# Altium footprint library Switches.PcbLib: 117 footprints (part 3 of 8)
Each footprint in its own frame and in the unit in brackets; x right, y up, seen from the top. Pads: shape width x height; smd on the part's side, far side on the other; paste and mask are expansions set on the pad; w line width, h text height; cw(c..) or ccw(c..) is an arc to the next point about the centre after c.
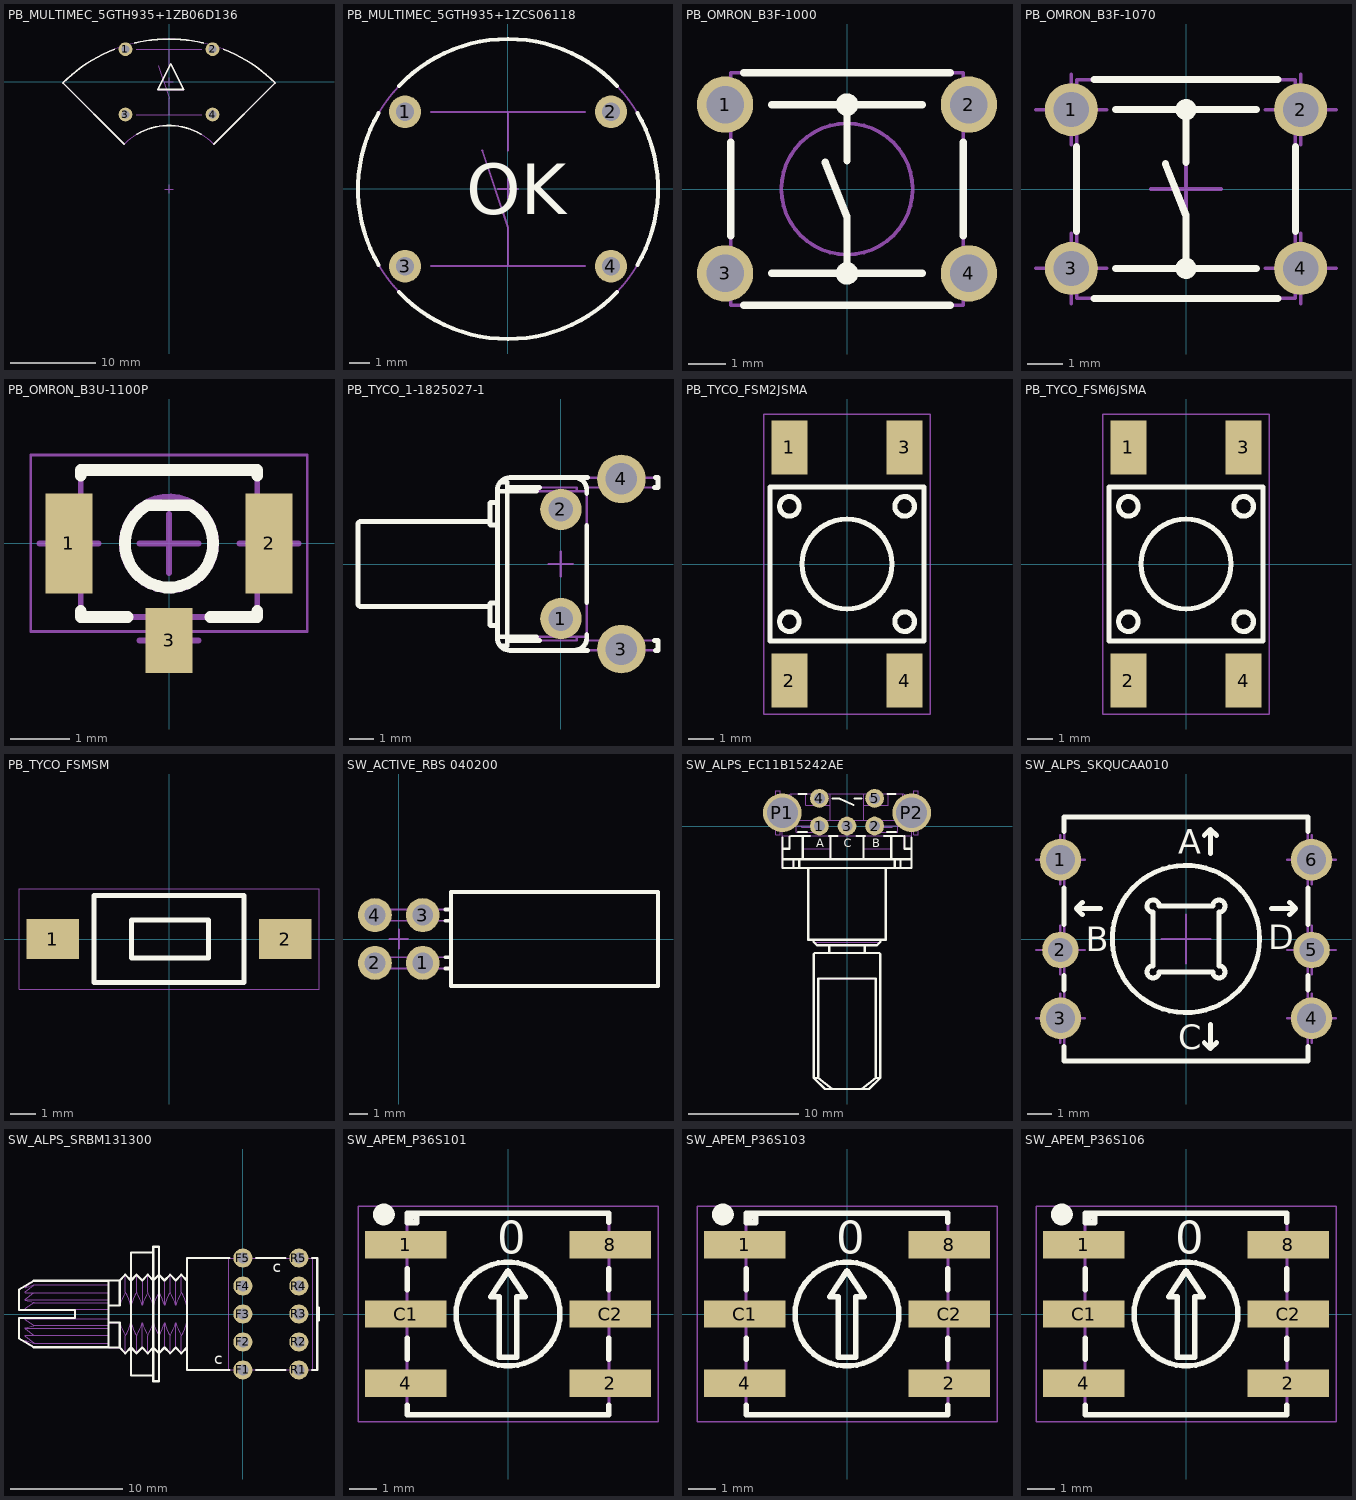
[diagram p2: the footprints below, top view; thin cyan lines are the x and y axes]

## PB_MULTIMEC_5GTH935+1ZB06D136 [mm] "Body 10.1x10.1mm, Pushbutton Switch Arc 24.76mmx17.5mm, MULTIMEC 5GTH935+1ZB"
height 12.5
pads (4):
  round 1.6 hole 0.9: 1(-5.08,3.81) 2(5.08,3.81) 3(-5.08,-3.81) 4(5.08,-3.81)
Top Overlay:
  lines w0.2: -6.38,3.796 ccw(c0,-12.5) -12.374,-0.126 -5.233,-7.267 ; -4.002,4.536 cw(c0,-12.5) 4.002,4.536 ; -3.751,-6.121 cw(c0,-12.5) 3.751,-6.121 ; 5.233,-7.267 12.374,-0.126 ccw(c0,-12.5) 6.38,3.796 ; -1.292,-0.896 1.708,-0.896 0.208,2.104 -1.292,-0.896
Mechanical 8:
  lines w0.1: -5.58,-3.81 -5.08,-3.81 ; -5.58,3.81 -5.08,3.81 ; -5.08,-4.31 -5.08,-3.81 ; -5.08,-3.31 -5.08,-3.81 ; -5.08,3.31 -5.08,3.81 ; -5.08,4.31 -5.08,3.81 ; -4.58,-3.81 -5.08,-3.81 ; -4.58,3.81 -5.08,3.81 ; -3.81,-3.81 3.81,-3.81 ; -3.81,3.81 3.81,3.81 ; -1.27,1.905 0,-1.905 0,-3.81 ; -0.5,-12.5 0,-12.5 ; 0,-13 0,-12.5 ; 0,-12 0,-12.5 ; 0,1.905 0,3.81 ; 0.5,-12.5 0,-12.5 ; 4.58,-3.81 5.08,-3.81 ; 4.58,3.81 5.08,3.81 ; 5.08,-4.31 5.08,-3.81 ; 5.08,-3.31 5.08,-3.81 ; 5.08,3.31 5.08,3.81 ; 5.08,4.31 5.08,3.81 ; 5.58,-3.81 5.08,-3.81 ; 5.58,3.81 5.08,3.81 ; 0,0 -0.5,0 0,0 ; 0,0 0,0.5 0,0 ; 0,0 0.5,0 0,0 ; 0,0 0,-0.5 0,0
  text "3" at -4.248,-2.975 h1
  text "4" at 3.372,-2.975 h1
  text "2" at 3.372,2.105 h1
  text "1" at -4.248,2.105 h1
Mechanical 14:
  lines w0.1: 5.23,-7.27 ccw(c-0.002,-12.494) -5.233,-7.267 -12.374,-0.126 cw(c0,-12.5) 12.374,-0.126 5.233,-7.267 ; -1.292,-0.896 1.708,-0.896 0.208,2.104 -1.292,-0.896
3D body "PB_MULTIMEC_5GTH935+1ZB06D136.stp": height 12.21, standoff -3.9, extent -11.9,-7.137 11.9,5

## PB_MULTIMEC_5GTH935+1ZCS06118 [mm] "Body 10.1x10.1mm, Pushbutton Switch Round Diam 14.3mm, MULTIMEC 5GTH935+1ZCS"
height 11.7
pads (4):
  round 1.6 hole 0.9: 1(-5.08,3.81) 2(5.08,3.81) 3(-5.08,-3.81) 4(5.08,-3.81)
Top Overlay:
  lines w0.2: -6.379,-3.751 cw(c0,0) -6.379,3.751 ; -5.387,-5.073 ccw(c0,0) 5.387,-5.073 ; -5.387,5.073 cw(c0,0) 5.387,5.073 ; 6.379,-3.751 ccw(c0,0) 6.379,3.751
  text "OK" at -2.055,-1.25 h2.5
Mechanical 8:
  lines w0.1: -5.58,-3.81 -5.08,-3.81 ; -5.58,3.81 -5.08,3.81 ; -5.08,-4.31 -5.08,-3.81 ; -5.08,-3.31 -5.08,-3.81 ; -5.08,3.31 -5.08,3.81 ; -5.08,4.31 -5.08,3.81 ; -4.58,-3.81 -5.08,-3.81 ; -4.58,3.81 -5.08,3.81 ; -3.81,-3.81 3.81,-3.81 ; -3.81,3.81 3.81,3.81 ; -1.27,1.905 0,-1.905 0,-3.81 ; -0.5,0 0,0 ; 0,-0.5 0,0 ; 0,0.5 0,0 ; 0,1.905 0,3.81 ; 0.5,0 0,0 ; 4.58,-3.81 5.08,-3.81 ; 4.58,3.81 5.08,3.81 ; 5.08,-4.31 5.08,-3.81 ; 5.08,-3.31 5.08,-3.81 ; 5.08,3.31 5.08,3.81 ; 5.08,4.31 5.08,3.81 ; 5.58,-3.81 5.08,-3.81 ; 5.58,3.81 5.08,3.81
  text "1" at -4.248,2.105 h1
  text "2" at 3.372,2.105 h1
  text "4" at 3.372,-2.975 h1
  text "3" at -4.248,-2.975 h1
Mechanical 14:
  circle w0.1: c0,0 r7.4
  text "OK" at -2.055,-1.25 h2.5
3D body "PB_MULTIMEC_5GTH935+1ZCS06118.stp": height 11.69, standoff -3.9, extent -7.148,-7.158 7.148,7.138

## PB_OMRON_B3F-1000 [mm] "6x6mm Model, Horizontal, Flat Plunger Type (without Ground Terminal) Pushbutton Switch, OMRON B3F Series"
height 4.5
pads (4):
  round 1.5 hole 1: 1(-3.25,2.25) 2(3.25,2.25) 3(-3.25,-2.25) 4(3.25,-2.25)
Top Overlay:
  circle w0.2: c0,2.25 r0.2
  circle w0.2: c0,-2.25 r0.2
  lines w0.2: -3.1,-1.25 -3.1,1.25 ; -2.75,-3.1 2.75,-3.1 ; -2.75,3.1 2.75,3.1 ; -2,-2.25 2,-2.25 ; -2,2.25 2,2.25 ; -0.586,0.716 0,-0.75 0,-2.25 ; 0,0.75 0,2.25 ; 3.1,-1.25 3.1,1.25
Mechanical 14:
  circle w0.1: c0,0 r1.75
  lines w0.1: -3.1,-2.6 -3.4,-2.6 -3.4,-1.9 -3.1,-1.9 ; -3.1,1.9 -3.4,1.9 -3.4,2.6 -3.1,2.6 ; 3.1,-2.6 3.4,-2.6 3.4,-1.9 3.1,-1.9 ; 3.1,1.9 3.4,1.9 3.4,2.6 3.1,2.6 ; -3.1,-3.1 3.1,-3.1 3.1,3.1 -3.1,3.1 -3.1,-3.1
3D body "PB_OMRON_B3F-1000.stp": height 4.3, standoff -3.6, extent -3.4,-3.1 3.4,3.1

## PB_OMRON_B3F-1070 [mm] "6x6mm Model, Horizontal, Flat Plunger Type (without Ground Terminal) Pushbutton Switch, OMRON B3F Series"
height 9.5
pads (4):
  round 1.5 hole 1: 1(-3.25,2.25) 2(3.25,2.25) 3(-3.25,-2.25) 4(3.25,-2.25)
Top Overlay:
  circle w0.2: c0,2.25 r0.2
  circle w0.2: c0,-2.25 r0.2
  lines w0.2: -3.1,-1.2 -3.1,1.2 ; -2.6,-3.1 2.6,-3.1 ; -2.6,3.1 2.6,3.1 ; -2,-2.25 2,-2.25 ; -2,2.25 2,2.25 ; -0.586,0.716 0,-0.75 0,-2.25 ; 0,0.75 0,2.25 ; 3.1,-1.2 3.1,1.2
Mechanical 8:
  lines w0.1: -4.25,-2.25 -3.25,-2.25 ; -4.25,2.25 -3.25,2.25 ; -3.25,-3.25 -3.25,-2.25 ; -3.25,-1.25 -3.25,-2.25 ; -3.25,1.25 -3.25,2.25 ; -3.25,3.25 -3.25,2.25 ; -2.25,-2.25 -3.25,-2.25 ; -2.25,2.25 -3.25,2.25 ; -1,0 0,0 ; 0,-1 0,0 ; 0,1 0,0 ; 1,0 0,0 ; 2.25,-2.25 3.25,-2.25 ; 2.25,2.25 3.25,2.25 ; 3.25,-3.25 3.25,-2.25 ; 3.25,-1.25 3.25,-2.25 ; 3.25,1.25 3.25,2.25 ; 3.25,3.25 3.25,2.25 ; 4.25,-2.25 3.25,-2.25 ; 4.25,2.25 3.25,2.25
Mechanical 14:
  circle w0.1: c0,2.25 r0.1
  circle w0.1: c0,-2.25 r0.1
  lines w0.1: -3.1,-2.6 -3.4,-2.6 -3.4,-1.9 -3.1,-1.9 ; -3.1,1.9 -3.4,1.9 -3.4,2.6 -3.1,2.6 ; -2,-2.25 2,-2.25 ; -2,2.25 2,2.25 ; -0.586,0.716 0,-0.75 0,-2.25 ; 0,0.75 0,2.25 ; 3.1,-2.6 3.4,-2.6 3.4,-1.9 3.1,-1.9 ; 3.1,1.9 3.4,1.9 3.4,2.6 3.1,2.6 ; -3.1,-3.1 -3.1,3.1 3.1,3.1 3.1,-3.1 -3.1,-3.1
3D body "PB_OMRON_B3F-1070.stp": height 9.5, standoff -3.6, extent -3.4,-3.1 3.4,3.1

## PB_OMRON_B3U-1100P [mm] "Body 1.2x3x2.5mm Ultra-Small Tactile Pushbutton Switch, (with Ground Terminal), OMRON B3U Series"
height 1.75
pads (3):
  rect 0.8x1.7 smd: 1(-1.7,0) 2(1.7,0)
  rect 0.8x1.1 smd: 3(0,-1.65)
Top Overlay:
  lines w0.2: -1.5,-1.15 -1.5,-1.25 -0.7,-1.25 ; -1.5,1.15 -1.5,1.25 1.5,1.25 1.5,1.15 ; 0.7,-1.25 1.5,-1.25 1.5,-1.15 ; -0.374,0.65 ccw(c0,0) 0.374,0.65 -0.374,0.65
Mechanical 8:
  lines w0.1: -2.2,0 -1.7,0 ; -1.7,-0.5 -1.7,0 ; -1.7,0.5 -1.7,0 ; -1.2,0 -1.7,0 ; -0.5,-1.65 0,-1.65 ; -0.5,0 0,0 ; 0,-2.15 0,-1.65 ; 0,-1.15 0,-1.65 ; 0,-0.5 0,0 ; 0,0.5 0,0 ; 0.5,-1.65 0,-1.65 ; 0.5,0 0,0 ; 1.2,0 1.7,0 ; 1.7,-0.5 1.7,0 ; 1.7,0.5 1.7,0 ; 2.2,0 1.7,0
Mechanical 14:
  circle w0.1: c0,0 r0.8
  lines w0.1: -1.505,-0.701 -2.006,-0.701 -2.006,0.701 -1.505,0.701 ; -0.251,-1.25 -0.251,-1.959 0.251,-1.959 0.251,-1.25 ; 1.505,-0.701 2.006,-0.701 2.006,0.701 1.505,0.701 ; -1.5,-1.25 1.5,-1.25 1.5,1.25 -1.5,1.25 -1.5,-1.25 ; -0.374,0.65 ccw(c0,0) 0.374,0.65 -0.374,0.65
Mechanical 15:
  lines w0.05: -2.35,-1.5 -2.35,1.5 2.35,1.5 2.35,-1.5 -2.35,-1.5
3D body "PB_OMRON_B3U-1100P.stp": height 1.75, standoff 0, extent -2,-1.95 2,1.25

## PB_TYCO_1-1825027-1 [mm] "Right Angle Micro Miniature Tactile Pushbutton Switche, Round Actuator Length = 5.74mm, FSMRAJ Serie"
height 7.01
pads (4):
  round 1.7 hole 1: 1(0,-2.25) 2(0,2.25)
  round 2 hole 1.3: 3(2.49,-3.505) 4(2.49,3.505)
Top Overlay:
  lines w0.2: -2.921,-1.753 -8.23,-1.753 cw(c-8.23,-1.626) -8.357,-1.626 -8.357,1.626 cw(c-8.23,1.626) -8.23,1.753 -2.921,1.753 ; -2.616,-2.997 -2.21,-2.997 -1.002,-2.997 ; -2.616,-2.54 -2.87,-2.54 cw(c-2.87,-2.489) -2.921,-2.489 -2.921,-1.651 cw(c-2.87,-1.651) -2.87,-1.6 -2.616,-1.6 ; -2.616,1.6 -2.87,1.6 cw(c-2.87,1.651) -2.921,1.651 -2.921,2.489 cw(c-2.87,2.489) -2.87,2.54 -2.616,2.54 ; -2.616,2.997 -2.21,2.997 -1.002,2.997 ; -2.494,-3.378 -2.21,-3.378 -2.21,3.378 -2.494,3.378 ; -2.21,-3.15 -0.868,-3.15 ; -2.21,3.15 -0.868,3.15 ; 0.559,-3.556 ccw(c0.559,-3.048) 1.067,-3.048 ; 0.559,3.556 cw(c0.559,3.048) 1.067,3.048 ; 1.067,-3.15 1.067,-2.901 ; 1.067,-1.599 1.067,1.599 ; 1.067,2.901 1.067,3.15 ; 1.091,-3.556 -2.108,-3.556 cw(c-2.108,-3.048) -2.616,-3.048 -2.616,3.048 cw(c-2.108,3.048) -2.108,3.556 1.091,3.556 ; 3.844,-3.15 4.001,-3.15 4.001,-3.556 3.889,-3.556 ; 3.844,3.15 4.001,3.15 4.001,3.556 3.889,3.556
Mechanical 8:
  lines w0.1: -0.5,-2.25 0,-2.25 ; -0.5,0 0,0 ; -0.5,2.25 0,2.25 ; 0,-2.75 0,-2.25 ; 0,-1.75 0,-2.25 ; 0,-0.5 0,0 ; 0,0.5 0,0 ; 0,1.75 0,2.25 ; 0,2.75 0,2.25 ; 0.5,-2.25 0,-2.25 ; 0.5,0 0,0 ; 0.5,2.25 0,2.25 ; 1.99,-3.505 2.49,-3.505 ; 1.99,3.505 2.49,3.505 ; 2.49,-4.005 2.49,-3.505 ; 2.49,-3.005 2.49,-3.505 ; 2.49,3.005 2.49,3.505 ; 2.49,4.005 2.49,3.505 ; 2.99,-3.505 2.49,-3.505 ; 2.99,3.505 2.49,3.505
Mechanical 14:
  lines w0.1: -2.921,-1.753 -8.23,-1.753 cw(c-8.23,-1.626) -8.357,-1.626 -8.357,1.626 cw(c-8.23,1.626) -8.23,1.753 -2.921,1.753 ; -2.616,-2.997 -2.21,-2.997 1.067,-2.997 1.067,3.15 4.001,3.15 4.001,3.556 -2.108,3.556 ccw(c-2.108,3.048) -2.616,3.048 -2.616,-3.048 ccw(c-2.108,-3.048) -2.108,-3.556 4.001,-3.556 4.001,-3.15 1.067,-3.15 ; -2.616,-2.54 -2.87,-2.54 cw(c-2.87,-2.489) -2.921,-2.489 -2.921,-1.651 cw(c-2.87,-1.651) -2.87,-1.6 -2.616,-1.6 ; -2.616,1.6 -2.87,1.6 cw(c-2.87,1.651) -2.921,1.651 -2.921,2.489 cw(c-2.87,2.489) -2.87,2.54 -2.616,2.54 ; -2.616,2.997 -2.21,2.997 1.067,2.997 ; -2.494,-3.378 -2.21,-3.378 -2.21,3.378 -2.494,3.378 ; -2.21,-3.15 0.66,-3.15 0.66,-2.997 ; -2.21,3.15 0.66,3.15 0.66,2.997 ; 0.559,-3.556 ccw(c0.559,-3.048) 1.067,-3.048 ; 0.559,3.556 cw(c0.559,3.048) 1.067,3.048 ; 1.994,-3.556 1.994,-4.204 2.985,-4.204 2.985,-3.556 ; 1.994,3.556 1.994,4.204 2.985,4.204 2.985,3.556 ; 2.654,-3.556 2.654,-3.15 ; 2.654,3.15 2.654,3.556
3D body "PB_TYCO_1-1825027-1.stp": height 7.01, standoff -3.51, extent -8.356,-4.204 4.001,4.204

## PB_TYCO_FSM2JSMA [mm] "Body 6mm x 6mm, Surface Mount Tactile Switches, TYCO FSMJSMA Series"
height 4.59
pads (4):
  rect 1.4x2.1 smd: 1(-2.25,4.55) 2(-2.25,-4.55) 3(2.25,4.55) 4(2.25,-4.55)
Top Overlay:
  circle w0.2: c0,0 r1.753
  circle w0.2: c2.248,2.248 r0.381
  circle w0.2: c2.248,-2.248 r0.381
  circle w0.2: c-2.248,2.248 r0.381
  circle w0.2: c-2.248,-2.248 r0.381
  lines w0.2: -3,-3 -3,3 3,3 3,-3 -3,-3
Mechanical 14:
  circle w0.1: c0,0 r1.753
  circle w0.1: c2.248,2.248 r0.381
  circle w0.1: c2.248,-2.248 r0.381
  circle w0.1: c-2.248,2.248 r0.381
  circle w0.1: c-2.248,-2.248 r0.381
  lines w0.1: -3,-3 -3,3 3,3 3,-3 -3,-3
Mechanical 15:
  lines w0.05: -3.25,-5.85 -3.25,5.85 3.25,5.85 3.25,-5.85 -3.25,-5.85
3D body "PB_TYCO_FSM2JSMA.stp": height 4.39, standoff 0, extent -3,-5 3,5

## PB_TYCO_FSM6JSMA [mm] "Body 6mm x 6mm, Surface Mount Tactile Switches, TYCO FSM6JSMA Series"
height 7.11
pads (4):
  rect 1.4x2.1 smd: 1(-2.25,4.55) 2(-2.25,-4.55) 3(2.25,4.55) 4(2.25,-4.55)
Top Overlay:
  circle w0.2: c-2.248,-2.248 r0.381
  circle w0.2: c-2.248,2.248 r0.381
  circle w0.2: c2.248,-2.248 r0.381
  circle w0.2: c2.248,2.248 r0.381
  circle w0.2: c0,0 r1.753
  lines w0.2: -3,-3 3,-3 3,3 -3,3 -3,-3
Mechanical 14:
  circle w0.1: c-2.248,-2.248 r0.381
  circle w0.1: c-2.248,2.248 r0.381
  circle w0.1: c2.248,-2.248 r0.381
  circle w0.1: c2.248,2.248 r0.381
  circle w0.1: c0,0 r1.753
  lines w0.1: -3,-3 3,-3 3,3 -3,3 -3,-3
Mechanical 15:
  lines w0.05: -3.25,-5.85 3.25,-5.85 3.25,5.85 -3.25,5.85 -3.25,-5.85
3D body "PB_TYCO_FSM6JSMA.stp": height 7.11, standoff 0, extent -3,-5 3,5

## PB_TYCO_FSMSM [mm] "Body 3.5x6.0mm, Pushbutton Switch,  TYCO FSMSM Serie"
height 4.3
pads (2):
  rect 2.1x1.6 smd: 1(-4.65,0) 2(4.65,0)
Top Overlay:
  lines w0.2: -3,-1.75 3,-1.75 3,1.75 -3,1.75 -3,-1.75 ; -1.5,-0.75 1.575,-0.75 1.575,0.75 -1.5,0.75 -1.5,-0.75
Mechanical 14:
  lines w0.1: -3,-1.75 -3,1.75 3,1.75 3,-1.75 -3,-1.75 ; -1.5,-0.75 -1.5,0.75 1.575,0.75 1.575,-0.75 -1.5,-0.75
Mechanical 15:
  lines w0.05: -6,-2 6,-2 6,2 -6,2 -6,-2
3D body "PB_TYCO_FSMSM.stp": height 4.3, standoff 0, extent -5,-1.75 5,1.75

## SW_ACTIVE_RBS 040200 [mm] "Body L  11mm x W 5mm x H 6mm - Rollerball Tilt Switch"
height 6
pads (4):
  round 1.8 hole 1.1: 1(1.27,-1.27) 2(-1.27,-1.27) 3(1.27,1.27) 4(-1.27,1.27)
Top Overlay:
  lines w0.2: 2.483,-1.57 2.77,-1.57 ; 2.483,-0.97 2.77,-0.97 ; 2.483,0.97 2.77,0.97 ; 2.483,1.57 2.77,1.57 ; 2.77,-2.5 13.77,-2.5 13.77,2.5 2.77,2.5 2.77,-2.5
Mechanical 8:
  lines w0.1: -1.77,-1.27 -1.27,-1.27 ; -1.77,1.27 -1.27,1.27 ; -1.27,-1.77 -1.27,-1.27 ; -1.27,-0.77 -1.27,-1.27 ; -1.27,0.77 -1.27,1.27 ; -1.27,1.77 -1.27,1.27 ; -0.77,-1.27 -1.27,-1.27 ; -0.77,1.27 -1.27,1.27 ; -0.5,0 0,0 ; 0,-0.5 0,0 ; 0,0.5 0,0 ; 0.5,0 0,0 ; 0.77,-1.27 1.27,-1.27 ; 0.77,1.27 1.27,1.27 ; 1.27,-1.77 1.27,-1.27 ; 1.27,-0.77 1.27,-1.27 ; 1.27,0.77 1.27,1.27 ; 1.27,1.77 1.27,1.27 ; 1.77,-1.27 1.27,-1.27 ; 1.77,1.27 1.27,1.27
Mechanical 14:
  lines w0.1: 2.77,-1.57 -1.57,-1.57 -1.57,-0.97 2.77,-0.97 ; 2.77,0.97 -1.57,0.97 -1.57,1.57 2.77,1.57 ; 2.77,-2.5 13.77,-2.5 13.77,2.5 2.77,2.5 2.77,-2.5
3D body "SW_ACTIVE_RBS 040200.stp": height 6, standoff -3.6, extent -1.57,-2.5 13.77,2.5

## SW_ALPS_EC11B15242AE [mm] "Encoder, Horizontal With Push-on Switch, ALPS EC11 Series"
height 13.8
pads (7):
  round 1.7 hole 1: 1(-2.5,0) 2(2.5,0) 3(0,0) 4(-2.5,2.5) 5(2.5,2.5)
  round 3.5 hole 2.8: P1(-5.85,1.2) P2(5.85,1.2)
Top Overlay:
  lines w0.2: -5.85,-3 5.85,-3 ; -5.85,-2.05 -5.2,-2.05 -5.2,-0.954 ; -5.85,-1.05 -5.85,-3.8 5.85,-3.8 5.85,-1.05 ; -5.042,-0.9 -3.367,-0.9 ; -4.85,-3.8 -4.85,-3 ; -4.436,-0.55 -3.622,-0.55 ; -4.376,2.9 -3.684,2.9 ; -4.33,-3.8 -4.33,-3 ; -4,-3 -4,-0.9 ; -3.5,-3.8 -3.5,-10.3 3.5,-10.3 3.5,-3.8 ; -3.02,-10.3 -3.02,-10.5 -2.72,-10.8 2.72,-10.8 3.02,-10.5 3.02,-10.3 ; -1.633,-0.9 -0.867,-0.9 ; -1.614,-11.5 -1.614,-10.8 ; -1.5,-3 -1.5,-0.9 ; -1.323,-23.8 -2.598,-22.8 ; -1.3,2.5 -0.7,2.5 0.6,1.9 ; 0.7,2.5 1.3,2.5 ; 0.867,-0.9 1.633,-0.9 ; 1.323,-23.8 2.598,-22.8 ; 1.5,-3 1.5,-0.9 ; 1.614,-11.5 1.614,-10.8 ; 3.367,-0.9 5.042,-0.9 ; 3.622,-0.55 4.436,-0.55 ; 3.684,2.9 4.376,2.9 ; 4,-3 4,-0.9 ; 4.33,-3.8 4.33,-3 ; 4.85,-3.8 4.85,-3 ; 5.2,-0.9 5.2,-2.05 5.85,-2.05 ; -3,-22.8 -2.598,-22.8 ; -3,-22.8 -3,-11.6 -2.9,-11.5 2.9,-11.5 3,-11.6 3,-22.8 ; -3,-22.8 -2,-23.8 2,-23.8 3,-22.8 ; -2.598,-22.8 -2.598,-13.8 2.598,-13.8 2.598,-22.8 ; 2.598,-22.8 3,-22.8
  text "A" at -2.8,-1.9 h0.75
  text "B" at 2.3,-1.9 h0.75
  text "C" at -0.3,-1.9 h0.75
Mechanical 8:
  circle w0.05: c5.85,1.2 r1.4
  circle w0.05: c-5.85,1.2 r1.4
  circle w0.05: c-2.5,2.5 r0.5
  circle w0.05: c2.5,2.5 r0.5
  circle w0.05: c-2.5,0 r0.5
  circle w0.05: c2.5,0 r0.5
  circle w0.05: c0,0 r0.5
  lines w0.05: -6.35,1.2 -5.85,1.2 ; -5.85,0.7 -5.85,1.2 ; -5.85,1.7 -5.85,1.2 ; -5.35,1.2 -5.85,1.2 ; -3,0 -2.5,0 ; -3,2.5 -2.5,2.5 ; -2.5,-0.5 -2.5,0 ; -2.5,0.5 -2.5,0 ; -2.5,2 -2.5,2.5 ; -2.5,3 -2.5,2.5 ; -2,0 -2.5,0 ; -2,2.5 -2.5,2.5 ; -0.5,0 0,0 ; 0,-0.5 0,0 ; 0,0.5 0,0 ; 0.5,0 0,0 ; 2,0 2.5,0 ; 2,2.5 2.5,2.5 ; 2.5,-0.5 2.5,0 ; 2.5,0.5 2.5,0 ; 2.5,2 2.5,2.5 ; 2.5,3 2.5,2.5 ; 3,0 2.5,0 ; 3,2.5 2.5,2.5 ; 5.35,1.2 5.85,1.2 ; 5.85,0.7 5.85,1.2 ; 5.85,1.7 5.85,1.2 ; 6.35,1.2 5.85,1.2 ; -6.75,0.15 -6.75,2.25 -4.95,2.25 -4.95,0.15 -6.75,0.15 ; 4.95,0.15 4.95,2.25 6.75,2.25 6.75,0.15 4.95,0.15
Mechanical 14:
  lines w0.1: -6.45,0.2 -7.05,0.2 -7.05,2.2 -6.45,2.2 ; -6.45,0.4 -5.85,0.4 ; -6.45,2.3 -5.85,2.3 ; -6.05,0.4 -6.05,-0.8 -6.45,-0.8 -6.45,3.2 -6.05,3.2 -6.05,2.3 ; -5.85,-3 5.85,-3 ; -5.85,-2.05 -5.2,-2.05 -5.2,-0.9 ; -5.85,-0.9 5.85,-0.9 ; -5.85,0.5 5.85,0.5 ; -5.45,0.5 -5.45,2.4 cw(c-4.95,2.4) -5.05,2.89 ; -5.44,2.5 -5.85,2.5 -5.85,-3.8 5.85,-3.8 5.85,2.5 5.44,2.5 ; -5.05,0.5 -5.05,2.9 5.05,2.9 5.05,0.5 ; -4.85,-3.8 -4.85,-3 ; -4.33,-3.8 -4.33,-3 ; -4.1,0.03 -4.1,-0.12 -2.9,-0.12 -2.9,0.03 ; -4,-3 -4,-0.9 ; -4,-2.05 -1.5,-2.05 ; -3.75,2.9 -3.75,1.9 -1.5,1.9 ; -3.5,-3.8 -3.5,-10.3 3.5,-10.3 3.5,-3.8 ; -3.02,-10.3 -3.02,-10.5 ; -1.614,-11.5 -1.614,-10.8 ; -1.5,-3 -1.5,-0.9 ; -1.5,0.5 -1.5,2.9 ; -1.323,-23.8 -2.598,-22.8 ; 1.323,-23.8 2.598,-22.8 ; 1.5,-3 1.5,-0.9 ; 1.5,-2.05 4,-2.05 ; 1.5,0.5 1.5,2.9 ; 1.5,1.9 3.75,1.9 3.75,2.9 ; 1.614,-11.5 1.614,-10.8 ; 2.9,0.03 2.9,-0.12 4.1,-0.12 4.1,0.03 ; 3.02,-10.3 3.02,-10.5 ; 4,-3 4,-0.9 ; 4.33,-3.8 4.33,-3 ; 4.85,-3.8 4.85,-3 ; 5.05,2.89 cw(c4.95,2.4) 5.45,2.4 5.45,0.5 ; 5.2,-0.9 5.2,-2.05 5.85,-2.05 ; 5.85,0.4 6.45,0.4 ; 5.85,2.3 6.45,2.3 ; 6.05,0.4 6.05,-0.8 6.45,-0.8 6.45,3.2 6.05,3.2 6.05,2.3 ; 6.45,0.2 7.05,0.2 7.05,2.2 6.45,2.2 ; -3.02,-10.5 3.02,-10.5 ; -3.02,-10.5 -2.72,-10.8 2.72,-10.8 3.02,-10.5 ; -3,-22.8 -2.598,-22.8 ; -3,-22.8 -3,-11.6 -2.9,-11.5 2.9,-11.5 3,-11.6 3,-22.8 ; -3,-22.8 -2,-23.8 2,-23.8 3,-22.8 ; -2.598,-22.8 -2.598,-13.8 2.598,-13.8 2.598,-22.8 ; 2.598,-22.8 3,-22.8 ; -4.6,-0.55 -2.4,-0.55 -2.4,0.03 -4.6,0.03 -4.6,-0.55 ; -3.25,2.38 -2,2.38 -2,2.63 -3.25,2.63 -3.25,2.38 ; 2,2.38 3.25,2.38 3.25,2.63 2,2.63 2,2.38 ; 2.4,-0.55 4.6,-0.55 4.6,0.03 2.4,0.03 2.4,-0.55
3D body "SW_ALPS_EC11B15242AE.stp": height 13.82, standoff -3.5, extent -7.05,-23.8 7.05,3.2

## SW_ALPS_SKQUCAA010 [mm] "Compact 10mm square TACT Switch type provides compound actions of 4-directional and center push"
height 10
pads (6):
  round 1.7 hole 1.2: 1(-5.15,3.25) 3(-5.15,-3.25) 4(5.15,-3.25) 6(5.15,3.25)
  round 1.5 hole 1: 2(-5.15,-0.45) 5(5.15,-0.45)
Top Overlay:
  circle w0.2: c0,0 r3.02
  lines w0.2: -5,-4.4 -5,-5 5,-5 5,-4.4 ; -5,-2.1 -5,-1.5 ; -5,0.6 -5,2.1 ; -5,4.4 -5,5 5,5 5,4.4 ; -4.25,1 -4.5,1.25 ; -4.25,1.5 -4.5,1.25 ; -3.5,1.25 -4.5,1.25 ; 0.75,-4.25 1,-4.5 ; 0.75,4.25 1,4.5 ; 1,-3.5 1,-4.5 ; 1,3.5 1,4.5 ; 1.25,-4.25 1,-4.5 ; 1.25,4.25 1,4.5 ; 3.5,1.25 4.5,1.25 ; 4.25,1 4.5,1.25 ; 4.25,1.5 4.5,1.25 ; 5,-2.1 5,-1.5 ; 5,0.6 5,2.1 ; -1.35,-1.1 ccw(c-1.35,-1.35) -1.1,-1.35 1.1,-1.35 ccw(c1.35,-1.35) 1.35,-1.1 1.35,1.1 ccw(c1.35,1.35) 1.1,1.35 -1.1,1.35 ccw(c-1.35,1.35) -1.35,1.1 -1.35,-1.1
  text "A" at -0.318,3.49 h1
  text "D" at 3.382,-0.41 h1
  text "B" at -4.118,-0.51 h1
  text "C" at -0.318,-4.51 h1
Mechanical 8:
  lines w0.1: -6.15,-3.25 -5.15,-3.25 ; -6.15,-0.45 -5.15,-0.45 ; -6.15,3.25 -5.15,3.25 ; -5.15,-4.25 -5.15,-3.25 ; -5.15,-2.25 -5.15,-3.25 ; -5.15,-1.45 -5.15,-0.45 ; -5.15,0.55 -5.15,-0.45 ; -5.15,2.25 -5.15,3.25 ; -5.15,4.25 -5.15,3.25 ; -4.15,-3.25 -5.15,-3.25 ; -4.15,-0.45 -5.15,-0.45 ; -4.15,3.25 -5.15,3.25 ; -1,0 0,0 ; 0,-1 0,0 ; 0,1 0,0 ; 1,0 0,0 ; 4.15,-3.25 5.15,-3.25 ; 4.15,-0.45 5.15,-0.45 ; 4.15,3.25 5.15,3.25 ; 5.15,-4.25 5.15,-3.25 ; 5.15,-2.25 5.15,-3.25 ; 5.15,-1.45 5.15,-0.45 ; 5.15,0.55 5.15,-0.45 ; 5.15,2.25 5.15,3.25 ; 5.15,4.25 5.15,3.25 ; 6.15,-3.25 5.15,-3.25 ; 6.15,-0.45 5.15,-0.45 ; 6.15,3.25 5.15,3.25
Mechanical 14:
  circle w0.1: c0,0 r3.02
  lines w0.1: -4.25,1 -4.5,1.25 ; -4.25,1.5 -4.5,1.25 ; -3.5,1.25 -4.5,1.25 ; 0.75,-4.25 1,-4.5 ; 0.75,4.25 1,4.5 ; 1,-3.5 1,-4.5 ; 1,3.5 1,4.5 ; 1.25,-4.25 1,-4.5 ; 1.25,4.25 1,4.5 ; 3.5,1.25 4.5,1.25 ; 4.25,1 4.5,1.25 ; 4.25,1.5 4.5,1.25 ; -5,-5 5,-5 5,5 -5,5 -5,-5 ; -1.35,-1.1 ccw(c-1.35,-1.35) -1.1,-1.35 1.1,-1.35 ccw(c1.35,-1.35) 1.35,-1.1 1.35,1.1 ccw(c1.35,1.35) 1.1,1.35 -1.1,1.35 ccw(c-1.35,1.35) -1.35,1.1 -1.35,-1.1
  text "A" at -0.318,3.49 h1
  text "D" at 3.382,-0.41 h1
  text "B" at -4.118,-0.51 h1
  text "C" at -0.318,-4.51 h1
3D body "SW_ALPS_SKQUCAA010.stp": height 10, standoff -3.5, extent -5.325,-5 5.325,5

## SW_ALPS_SRBM131300 [mm] "2 Poles, 3 Positions, Horizontal Rotary Switch, ALPS SRBM Series"
height 11.5
pads (10):
  round 1.7 hole 1: F1(0,-5) F2(0,-2.5) F3(0,0) F4(0,2.5) F5(0,5) R1(5,-5) R2(5,-2.5) R3(5,0) R4(5,2.5) R5(5,5)
Top Overlay:
  lines w0.2: -12,-2.96 -18.7,-2.96 -20,-2.2 -20,-0.35 -15,-0.35 -15,0.35 -20,0.35 -20,2.2 -18.7,2.96 -12,2.96 ; -12,-0.768 -11,-0.768 -11,-3 ; -12,0.768 -11,0.768 -11,3 ; -8,-5.5 -10,-5.5 -10,5.5 -8,5.5 ; -5,-3 -5.5,-3.5 -6,-3 -6.5,-3.5 -7,-3 -7.5,-3.5 -8,-3 -8.5,-3.5 -9,-3 -9.5,-3.5 -10,-3 -10.5,-3.5 -11,-3 ; -5,3 -5.5,3.5 -6,3 -6.5,3.5 -7,3 -7.5,3.5 -8,3 -8.5,3.5 -9,3 -9.5,3.5 -10,3 -10.5,3.5 -11,3 ; -1.2,-4.999 -5,-5 -5,5 -1.2,5.001 ; 1.2,-4.999 3.8,-4.998 ; 1.2,5.001 3.8,5.002 ; 6.2,-4.998 6.65,-4.998 6.65,5.002 6.2,5.002 ; 6.65,-0.7 6.8,-0.55 6.8,0.55 6.65,0.7 ; -11,-3 -12,-3 -12,3 -11,3 ; -8,-6 -8,6 -7.5,6 -7.5,-6 -8,-6
  text "c" at 2.657,3.715 h1
  text "c" at -2.543,-4.485 h1
Mechanical 8:
  lines w0.1: -5,-5 -5,0 -5,5 ; -0.5,-5 0,-5 ; -0.5,-2.5 0,-2.5 ; -0.5,0 0,0 ; -0.5,2.5 0,2.5 ; -0.5,5 0,5 ; 0,-5.5 0,-5 ; 0,-4.5 0,-5 ; 0,-3 0,-2.5 ; 0,-2 0,-2.5 ; 0,-0.5 0,0 ; 0,0.5 0,0 ; 0,2 0,2.5 ; 0,3 0,2.5 ; 0,4.5 0,5 ; 0,5.5 0,5 ; 0.5,-5 0,-5 ; 0.5,-2.5 0,-2.5 ; 0.5,0 0,0 ; 0.5,2.5 0,2.5 ; 0.5,5 0,5 ; 4.5,-5 5,-5 ; 4.5,-2.5 5,-2.5 ; 4.5,0 5,0 ; 4.5,2.5 5,2.5 ; 4.5,5 5,5 ; 5,-5.5 5,-5 ; 5,-4.5 5,-5 ; 5,-3 5,-2.5 ; 5,-2 5,-2.5 ; 5,-0.5 5,0 ; 5,0.5 5,0 ; 5,2 5,2.5 ; 5,3 5,2.5 ; 5,4.5 5,5 ; 5,5.5 5,5 ; 5.5,-5 5,-5 ; 5.5,-2.5 5,-2.5 ; 5.5,0 5,0 ; 5.5,2.5 5,2.5 ; 5.5,5 5,5
Mechanical 14:
  lines w0.1: -19.463,-1.265 -12,-1.265 ; -19.463,-0.439 -12,-0.439 ; -19.463,0.439 -12,0.439 ; -19.463,1.265 -12,1.265 ; -19.392,-0.35 -19.463,-0.384 -19.463,-0.494 -18.7,-0.993 -18.7,-1.059 -19.463,-1.217 -19.463,-1.313 -18.7,-1.901 ; -19.392,0.35 -19.463,0.384 -19.463,0.494 -18.7,0.993 -18.7,1.059 -19.463,1.217 -19.463,1.313 -18.7,1.901 ; -18.7,-2.598 -12,-2.598 ; -18.7,-1.026 -12,-1.026 ; -18.7,1.026 -12,1.026 ; -18.7,2.598 -12,2.598 ; -12,-2.96 -18.7,-2.96 ; -12,-1.901 -18.7,-1.901 ; -12,-0.768 -11,-0.768 ; -12,0.768 -11,0.768 ; -12,1.901 -18.7,1.901 ; -12,2.96 -18.7,2.96 ; -5,-3 -5.5,-3.5 ; -5,-0.768 cw(c-9.851,0.567) -5.5,-1.96 ; -5,0.768 ccw(c-9.851,-0.567) -5.5,1.96 ; -5,3 -5.5,3.5 ; -1.25,-5 -1.25,5 ; -0.175,-5 -0.175,-5.3 0.175,-5.3 0.175,-5 ; -0.175,5 -0.175,5.3 0.175,5.3 0.175,5 ; 4.825,-5 4.825,-5.3 5.175,-5.3 5.175,-5 ; 4.825,5 4.825,5.3 5.175,5.3 5.175,5 ; 6.25,-4.999 6.25,5 ; 6.65,-0.7 6.8,-0.55 6.8,0.55 6.65,0.7 ; -18.7,-2.96 -19.463,-2.397 -19.463,-2.358 -18.7,-2.615 -18.7,-2.58 -19.463,-1.974 -19.458,-1.902 -18.7,-1.901 ; -18.7,-2.96 -20,-2.2 -20,-0.35 -15,-0.35 -15,0.35 -20,0.35 -20,2.2 -18.7,2.96 ; -18.7,1.901 -19.463,1.902 -19.463,1.974 -18.7,2.58 -18.7,2.615 -19.463,2.358 -19.463,2.397 -18.7,2.96 ; -11,-3 -11,-0.768 ; -11,-3 -12,-3 -12,3 -11,3 ; -11,-3 -10.5,-3.5 ; -11,-0.768 ccw(c-6.149,0.567) -10.5,-1.96 ; -11,0.768 cw(c-6.149,-0.567) -10.5,1.96 ; -11,0.768 -11,3 ; -11,3 -10.5,3.5 ; -10.5,-3.5 -10.5,-1.96 ; -10.5,-3.5 -10,-3 ; -10.5,-1.96 ccw(c-14.851,0.567) -10,-0.768 ; -10.5,1.96 cw(c-14.851,-0.567) -10,0.768 ; -10.5,1.96 -10.5,3.5 ; -10.5,3.5 -10,3 ; -10,-3 -10,-0.768 ; -10,-3 -9.5,-3.5 ; -10,-0.768 ccw(c-5.149,0.567) -9.5,-1.96 ; -10,0.768 cw(c-5.149,-0.567) -9.5,1.96 ; -10,0.768 -10,3 ; -10,3 -9.5,3.5 ; -9.5,-3.5 -9.5,-1.96 ; -9.5,-3.5 -9,-3 ; -9.5,-1.96 ccw(c-13.851,0.567) -9,-0.768 ; -9.5,1.96 cw(c-13.851,-0.567) -9,0.768 ; -9.5,1.96 -9.5,3.5 ; -9.5,3.5 -9,3 ; -9,-3 -9,-0.768 ; -9,-3 -8.5,-3.5 ; -9,-0.768 ccw(c-4.149,0.567) -8.5,-1.96 ; -9,0.768 cw(c-4.149,-0.567) -8.5,1.96 ; -9,0.768 -9,3 ; -9,3 -8.5,3.5 ; -8.5,-3.5 -8.5,-1.96 ; -8.5,-3.5 -8,-3 ; -8.5,-1.96 ccw(c-12.851,0.567) -8,-0.768 ; -8.5,1.96 cw(c-12.851,-0.567) -8,0.768 ; -8.5,1.96 -8.5,3.5 ; -8.5,3.5 -8,3 ; -8,-3 -8,-0.768 ; -8,-3 -7.5,-3.5 ; -8,-0.768 ccw(c-3.149,0.567) -7.5,-1.96 ; -8,0.768 cw(c-3.149,-0.567) -7.5,1.96 ; -8,0.768 -8,3 ; -8,3 -7.5,3.5 ; -7.5,-3.5 -7.5,-1.96 ; -7.5,-3.5 -7,-3 ; -7.5,-1.96 ccw(c-11.851,0.567) -7,-0.768 ; -7.5,1.96 cw(c-11.851,-0.567) -7,0.768 ; -7.5,1.96 -7.5,3.5 ; -7.5,3.5 -7,3 ; -7,-3 -7,-0.768 ; -7,-3 -6.5,-3.5 ; -7,-0.768 ccw(c-2.149,0.567) -6.5,-1.96 ; -7,0.768 cw(c-2.149,-0.567) -6.5,1.96 ; -7,0.768 -7,3 ; -7,3 -6.5,3.5 ; -6.5,-3.5 -6.5,-1.96 ; -6.5,-3.5 -6,-3 ; -6.5,-1.96 ccw(c-10.851,0.567) -6,-0.768 ; -6.5,1.96 cw(c-10.851,-0.567) -6,0.768 ; -6.5,1.96 -6.5,3.5 ; -6.5,3.5 -6,3 ; -6,-3 -6,-0.768 ; -6,-3 -5.5,-3.5 ; -6,-0.768 ccw(c-1.149,0.567) -5.5,-1.96 ; -6,0.768 cw(c-1.149,-0.567) -5.5,1.96 ; -6,0.768 -6,3 ; -6,3 -5.5,3.5 ; -5.5,-3.5 -5.5,-1.96 ; -5.5,1.96 -5.5,3.5 ; -5,-5 -5,5 6.65,5.002 6.65,-4.998 -5,-5
  text "Front" at -3.615,-2.068 h1
  text "c" at 2.657,3.715 h1
  text "P1" at 2.35,-4.525 h0.8
  text "c" at -2.543,-4.485 h1
  text "P2" at 2.275,-2.875 h0.8
  text "P1" at -3.025,-2.775 h0.8
  text "P2" at -3.05,-0.375 h0.8
  text "P3" at -3.1,2.1 h0.8
  text "P3" at 2.175,-0.55 h0.8
3D body "SW_ALPS_SRBM131300_Part1.stp": height 11.5, standoff -3, extent -20,-5.3 6.8,5.3
3D body "SW_ALPS_SRBM131300_Part2.stp": height 12.85, standoff 0.15, extent -10,-6 -7.5,6

## SW_APEM_P36S101 [mm] "Body 7.4x7.4mm SMT BCD Rotary Switches, APEM P36S Series"
height 3.85
pads (6):
  rect 3x1 smd: 1(-3.75,2.54) 2(3.75,-2.54) 4(-3.75,-2.54) 8(3.75,2.54) C1(-3.75,0) C2(3.75,0)
Top Overlay:
  circle w0.2: c0,0 r1.905
  circle w0.4: c-4.55,3.65 r0.2
  lines w0.2: -3.696,-3.353 -3.696,-3.696 3.696,-3.696 ; -3.696,-1.651 -3.696,-0.889 ; -3.696,0.889 -3.696,1.651 ; 3.696,-3.683 3.696,-3.353 ; 3.696,-1.651 3.696,-0.889 ; 3.696,0.889 3.696,1.651 ; 3.696,3.365 3.696,3.696 -3.696,3.696 -3.696,3.353 ; -3.696,3.353 -3.353,3.696 -3.353,3.353 -3.696,3.353 ; -0.635,0.635 -0.317,0.635 -0.318,-1.588 0.318,-1.588 0.317,0.635 0.635,0.635 0,1.587 -0.635,0.635
  text "0" at -0.4,2.2 h1.2
Mechanical 14:
  circle w0.1: c0,0 r1.905
  lines w0.1: -3.7,0 -3.7,-3.7 ; -3.7,-3.7 3.7,-3.7 3.7,3.7 -3.7,3.7 -3.7,-3.7 ; -0.635,0.635 -0.317,0.635 -0.318,-1.588 0.318,-1.588 0.317,0.635 0.635,0.635 0,1.587 -0.635,0.635
  text "0" at -0.4,2.2 h1.2
Mechanical 15:
  lines w0.05: -5.5,-3.95 -5.5,3.95 5.5,3.95 5.5,-3.95 -5.5,-3.95
3D body "SW_APEM_P36S101.stp": height 3.85, standoff 0, extent -4.78,-3.7 4.781,3.7

## SW_APEM_P36S103 [mm] "Body 7.4x7.4mm SMT Hexadecimal Rotary Switches, APEM P36S Series"
height 3.85
pads (6):
  rect 3x1 smd: 1(-3.75,2.54) 2(3.75,-2.54) 4(-3.75,-2.54) 8(3.75,2.54) C1(-3.75,0) C2(3.75,0)
Top Overlay:
  circle w0.4: c-4.55,3.65 r0.2
  circle w0.2: c0,0 r1.905
  lines w0.2: -3.696,-3.353 -3.696,-3.696 3.696,-3.696 ; -3.696,-1.651 -3.696,-0.889 ; -3.696,0.889 -3.696,1.651 ; 3.696,-3.683 3.696,-3.353 ; 3.696,-1.651 3.696,-0.889 ; 3.696,0.889 3.696,1.651 ; 3.696,3.365 3.696,3.696 -3.696,3.696 -3.696,3.353 ; -3.696,3.353 -3.353,3.353 -3.353,3.696 -3.696,3.353 ; -0.635,0.635 0,1.587 0.635,0.635 0.317,0.635 0.318,-1.588 -0.318,-1.588 -0.317,0.635 -0.635,0.635
  text "0" at -0.4,2.2 h1.2
Mechanical 14:
  circle w0.1: c0,0 r1.905
  lines w0.1: -3.7,0 -3.7,-3.7 ; -3.7,-3.7 -3.7,3.7 3.7,3.7 3.7,-3.7 -3.7,-3.7 ; -0.635,0.635 0,1.587 0.635,0.635 0.317,0.635 0.318,-1.588 -0.318,-1.588 -0.317,0.635 -0.635,0.635
  text "0" at -0.4,2.2 h1.2
Mechanical 15:
  lines w0.05: -5.5,-3.95 5.5,-3.95 5.5,3.95 -5.5,3.95 -5.5,-3.95
3D body "SW_APEM_P36S103.stp": height 3.85, standoff 0, extent -4.78,-3.7 4.781,3.7

## SW_APEM_P36S106 [mm] "Body 7.4x7.4mm SMT Hexadecimal Complement Rotary Switches, APEM P36S Series"
height 3.85
pads (6):
  rect 3x1 smd: 1(-3.75,2.54) 2(3.75,-2.54) 4(-3.75,-2.54) 8(3.75,2.54) C1(-3.75,0) C2(3.75,0)
Top Overlay:
  circle w0.4: c-4.55,3.65 r0.2
  circle w0.2: c0,0 r1.905
  lines w0.2: -3.696,-3.353 -3.696,-3.696 3.696,-3.696 ; -3.696,-1.651 -3.696,-0.889 ; -3.696,0.889 -3.696,1.651 ; 3.696,-3.683 3.696,-3.353 ; 3.696,-1.651 3.696,-0.889 ; 3.696,0.889 3.696,1.651 ; 3.696,3.365 3.696,3.696 -3.696,3.696 -3.696,3.353 ; -3.696,3.353 -3.353,3.353 -3.353,3.696 -3.696,3.353 ; -0.635,0.635 0,1.587 0.635,0.635 0.317,0.635 0.318,-1.588 -0.318,-1.588 -0.317,0.635 -0.635,0.635
  text "0" at -0.4,2.2 h1.2
Mechanical 14:
  circle w0.1: c0,0 r1.905
  lines w0.1: -3.7,0 -3.7,-3.7 ; -3.7,-3.7 -3.7,3.7 3.7,3.7 3.7,-3.7 -3.7,-3.7 ; -0.635,0.635 0,1.587 0.635,0.635 0.317,0.635 0.318,-1.588 -0.318,-1.588 -0.317,0.635 -0.635,0.635
  text "0" at -0.4,2.2 h1.2
Mechanical 15:
  lines w0.05: -5.5,-3.95 5.5,-3.95 5.5,3.95 -5.5,3.95 -5.5,-3.95
3D body "SW_APEM_P36S106.stp": height 3.85, standoff 0, extent -4.78,-3.7 4.781,3.7